# Altium footprint library UWRT_Footprint_Library_2020.PcbLib: 376 footprints (part 3 of 24)
Each footprint in its own frame and in the unit in brackets; x right, y up, seen from the top. Pads: shape width x height; smd on the part's side, far side on the other; paste and mask are expansions set on the pad; w line width, h text height; cw(c..) or ccw(c..) is an arc to the next point about the centre after c.
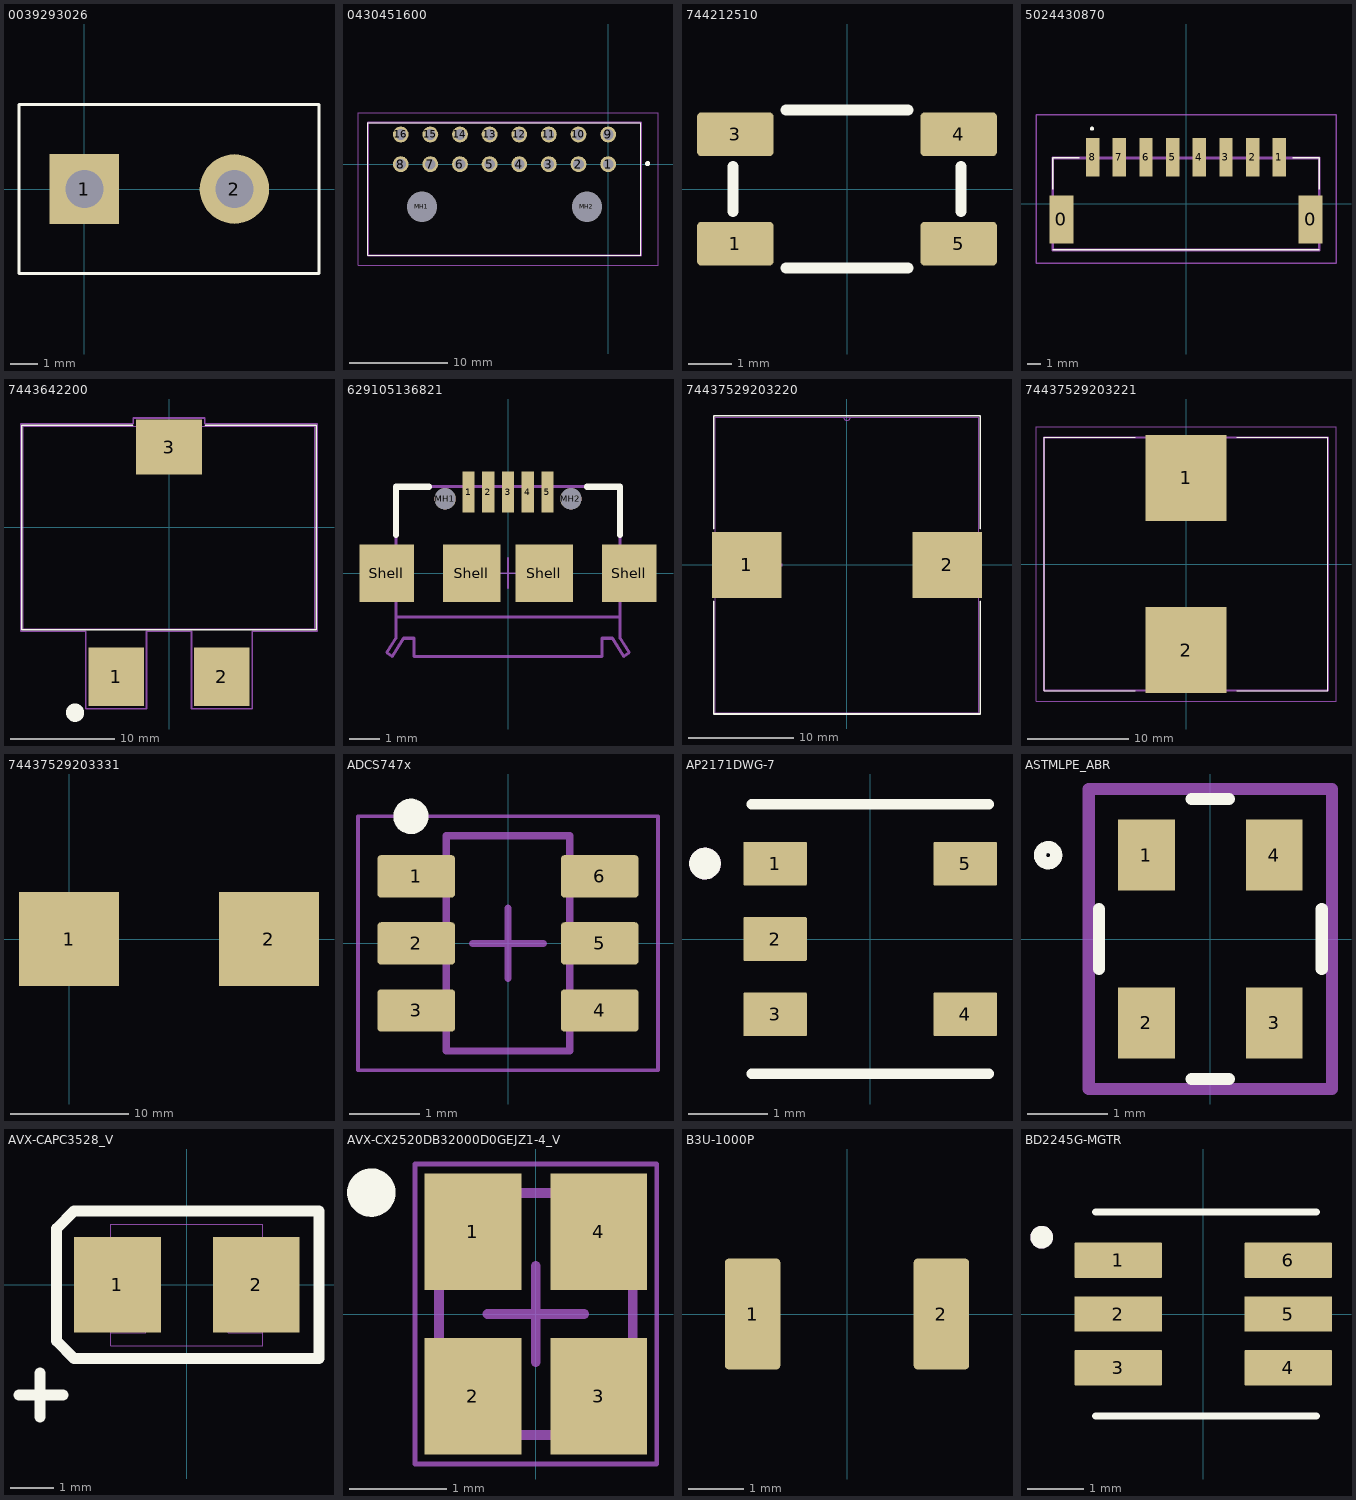
[diagram p2: the footprints below, top view; thin cyan lines are the x and y axes]

## 0039293026 [mm]
pads (2):
  rect 2.55x2.55 hole 1.4: 1(0,0)
  round 2.55 hole 1.4: 2(5.5,0)
Top Overlay:
  lines w0.12: -2.4,-3.1 8.6,-3.1 8.6,3.1 -2.4,3.1 -2.4,-3.1
3D body "039293026.stp": height 12.8, standoff -3.5, extent -2.4,-3.1 8.6,3.1

## 0430451600 [mm]
pads (18):
  round 1.605 hole 1.07: 1(0,0) 2(-3,0) 3(-6,0) 4(-9,0) 5(-12,0) 6(-15,0) 7(-18,0) 8(-21,0) 9(0,3) 10(-3,3) 11(-6,3) 12(-9,3) 13(-12,3) 14(-15,3) 15(-18,3) 16(-21,3)
  round 1.525 hole 3.05 unplated: MH1(-18.85,-4.32) MH2(-2.15,-4.32)
Top Overlay:
  lines w0.1: -24.325,-9.24 3.325,-9.24 3.325,4.2 -24.325,4.2 -24.325,-9.24
  lines w0.4: 4,0 ccw(c4,0.05) 4,0.1 ccw(c4,0.05) 4,0
Mechanical 13:
  lines w0.2: -24.325,-9.24 3.325,-9.24 3.325,4.2 -24.325,4.2 -24.325,-9.24
Mechanical 15:
  lines w0.1: -25.325,-10.24 5.05,-10.24 5.05,5.2 -25.325,5.2 -25.325,-10.24
3D body "0430451600.stp": height 8.77, standoff -3.17, extent -24.585,-8.89 3.565,3.35

## 744212510 [mm] "CMC HORIZONTAL 4 J-LEAD"
pads (4):
  rrect20% 1.75x1 smd: 1(-2.55,-1.25) 3(-2.55,1.25) 4(2.55,1.25) 5(2.55,-1.25)
Top Overlay:
  lines w0.254: -2.6,-0.508 -2.6,0.508 ; -1.397,-1.8 1.397,-1.8 ; -1.397,1.8 1.397,1.8 ; 2.6,-0.508 2.6,0.508
3D body "744212100_Download_STP_WE-SL1_rev1.stp": height 1.67, standoff 0.01, extent -2.6,-1.8 2.6,1.8

## 5024430870 [mm]
pads (10):
  rect 1.8x3.6 smd: 0(-9.35,-1.15) 0(9.35,-1.15)
  rect 1x2.9 smd: 1(7,3.5) 2(5,3.5) 3(3,3.5) 4(1,3.5) 5(-1,3.5) 6(-3,3.5) 7(-5,3.5) 8(-7,3.5)
Top Overlay:
  lines w0.1: -10,3.45 -10,1.1 -10,3.45 ; -10,3.45 -8,3.45 -10,3.45 ; 10,3.45 8,3.45 10,3.45 ; 10,3.45 10,1.1 10,3.45 ; -10,-3.45 10,-3.45 -10,-3.45
  lines w0.2: -7.1,5.65 ccw(c-7.05,5.65) -7,5.65 ; -7.1,5.65 cw(c-7.05,5.65) -7,5.65 ; -7.1,5.65 ccw(c-7.05,5.65) -7,5.65
Mechanical 13:
  lines w0.2: -10,-3.45 10,-3.45 10,3.45 -10,3.45 -10,-3.45
Mechanical 15:
  lines w0.1: -11.25,-4.45 11.25,-4.45 11.25,6.7 -11.25,6.7 -11.25,-4.45
3D body "502443-0870.stp": height 7.8, standoff 0, extent -10.07,-3.45 10.07,4.85

## 7443642200 [mm]
pads (3):
  rect 5.33x5.59 smd: 1(-5.075,-14.335) 2(5.075,-14.335)
  rect 6.35x5.28 smd: 3(0,7.72)
Top Overlay:
  circle w1.5: c-9.017,-17.78 r0.125
  lines w0.152: -3.508,9.83 -14.122,9.83 -14.122,-9.83 14.122,-9.83 14.122,9.83 3.508,9.83
Mechanical 13:
  lines w0.025: -13.995,-9.703 13.995,-9.703 13.995,9.703 -13.995,9.703 -13.995,-9.703
Mechanical 15:
  lines w0.152: -14.249,-9.957 -14.249,9.957 -3.429,9.957 -3.429,10.514 3.429,10.514 3.429,9.957 14.249,9.957 14.249,-9.957 7.994,-9.957 7.994,-17.384 2.156,-17.384 2.156,-9.957 -2.156,-9.957 -2.156,-17.384 -7.994,-17.384 -7.994,-9.957 -14.249,-9.957
3D body "7443640330_Download_STP_WE-HCF-2818_rev1 (1).stp": height 18.53, standoff 0.01, extent -14,-16.908 14,10.092

## 629105136821 [mm] "Micro USB 2.0 SMT Type B Horizontal 5 Contacts"
height 3
pads (11):
  rect 0.4x1.35 smd: 1(-1.3,2.675) 2(-0.65,2.675) 3(0,2.675) 4(0.65,2.675) 5(1.3,2.675)
  round 0.7 hole 0.7 unplated: MH1(-2.075,2.45) MH2(2.075,2.45)
  rect 1.8x1.9 smd: Shell(-4,0) Shell(4,0)
  rect 1.9x1.9 smd: Shell(-1.2,0) Shell(1.2,0)
Top Overlay:
  lines w0.2: -3.7,1.25 -3.7,2.85 -2.6,2.85 ; 2.6,2.85 3.7,2.85 3.7,1.25
Mechanical 2:
  lines w0.1: -3.7,-1.45 3.7,-1.45
  text "PCB Edge" at -1.2,-2.1 h0.41
Mechanical 13:
  lines w0.1: -1.425,2.85 -1.425,3.15 -1.175,3.15 -1.175,2.85 ; -0.775,2.85 -0.775,3.15 -0.525,3.15 -0.525,2.85 ; -0.125,2.85 -0.125,3.15 0.125,3.15 0.125,2.85 ; 0.525,2.85 0.525,3.15 0.775,3.15 0.775,2.85 ; 1.175,2.85 1.175,3.15 1.425,3.15 1.425,2.85 ; -4,-2.625 -3.7,-2.15 -3.7,2.85 3.7,2.85 3.7,-2.15 4,-2.625 3.825,-2.75 3.45,-2.15 3.1,-2.15 3.1,-2.75 -3.1,-2.75 -3.1,-2.15 -3.45,-2.15 -3.825,-2.75 -4,-2.625
Mechanical 15:
  lines w0.05: -0.5,0 0.5,0 ; 0,-0.5 0,0.5
3D body "629105136821.stp": height 2.69, standoff -0.61, extent -4,-2.73 4,3.173

## 74437529203220 [mil]
pads (2):
  rect 260x246 smd paste+0 mask+0: 1(-374,0) 2(374,0)
Top Overlay:
  lines w6: -497,-136.1 -497,-556 497,-556 497,-136.1 ; -497,136.1 -497,556 497,556 497,136.1
Mechanical 13:
  circle w0: c-244,0 r3
  lines w0: -12,551 ccw(c0,551) 12,551
  lines w1: -492,-551 492,-551 492,551 -492,551 -492,-551
3D body "IND_WE-HCF_2920_WRE.step": height 807.09, standoff 0, extent -492.01,-550.98 492.01,550.98

## 74437529203221 [mm]
pads (2):
  rect 8x8.5 smd: 1(0,8.5) 2(0,-8.5)
Top Overlay:
  lines w0.1: -5,-12.5 -14,-12.5 -14,12.5 -5,12.5 ; 5,-12.5 14,-12.5 14,12.5 5,12.5
Mechanical 13:
  lines w0.2: -14,-12.5 -14,12.5 14,12.5 14,-12.5 -14,-12.5
Mechanical 15:
  lines w0.1: -14.8,-13.55 -14.8,13.55 14.8,13.55 14.8,-13.55 -14.8,-13.55
3D body "74437529203221.stp": height 20.6, standoff 0, extent -14,-12.5 14,12.5

## 74437529203331 [mm]
pads (2):
  rect 8.5x8 smd: 1(0,0) 2(17,0)
3D body "IND_BOURNS_SRP1250.step": height 5.94, standoff 0, extent 6.853,-6.744 20.747,6.744
3D body "IND_BOURNS_SRP1250.step": height 5.94, standoff 0, extent -4.147,-6.744 9.747,6.744

## ADCS747x [mm] "sot-23-6"
pads (6):
  rrect17% 1.1x0.6 smd: 1(-1.3,0.95) 2(-1.3,0) 3(-1.3,-0.95) 4(1.3,-0.95) 5(1.3,0) 6(1.3,0.95)
Top Overlay:
  circle w0.25: c-1.375,1.8 r0.125
Mechanical 13:
  lines w0.1: -0.875,-1.525 -0.875,1.525 0.875,1.525 0.875,-1.525 -0.875,-1.525
Mechanical 15:
  lines w0.05: -2.125,-1.8 -2.125,1.8 2.125,1.8 2.125,-1.8 -2.125,-1.8
  lines w0.1: -0.5,0 0.5,0 ; 0,-0.5 0,0.5
3D body "DDC0006A.stp": height 0.9, standoff -0.02, extent -1.434,-1.485 1.434,1.485

## AP2171DWG-7 [mm]
pads (5):
  rrect5% 0.8x0.55 smd mask+0: 1(-1.2,0.95) 2(-1.2,0) 3(-1.2,-0.95) 4(1.2,-0.95) 5(1.2,0.95)
Top Overlay:
  circle w0.2: c-2.086,0.952 r0.1
  lines w0.127: -1.5,-1.7 1.5,-1.7 ; -1.5,1.7 1.5,1.7
Mechanical 13:
  circle w0.2: c-2.086,0.952 r0.1
3D body "SOT25_DIO.step": height 1.45, standoff 0, extent -1.5,-1.55 1.5,1.55

## ASTMLPE_ABR [mil]
pads (4):
  rect 28x35 smd paste+0: 1(-31.5,41.35) 2(-31.5,-41.35) 3(31.5,-41.35) 4(31.5,41.35)
Top Overlay:
  circle w6: c-80,41.35 r4
  lines w6: -55,-14.83 -55,14.83 ; -9.22,-69 9.22,-69 ; -9.22,69 9.22,69 ; 55,-14.83 55,14.83
Mechanical 15:
  lines w6: -60,-74 -60,-68.85 -60,68.85 -60,74 60,74 60,68.85 60,-68.85 60,-74 -60,-74
3D body "ASTMLPE_ABR.step": height 32.09, standoff 0, extent -45.5,-64.01 45.52,64.02
3D body: height 10, standoff 0, extent 0,0 10,10

## AVX-CAPC3528_V [mm] "SMT Capacitor, 2 Leads, Body 3.5x2.8mm"
pads (2):
  rect 2x2.2 smd: 1(-1.6,0) 2(1.6,0)
Top Overlay:
  lines w0.254: -3.87,-2.54 -2.854,-2.54 ; -3.381,-3.048 -3.381,-2.032 ; -3,-1.3 -2.6,-1.7 3.05,-1.7 3.05,1.7 -2.6,1.7 -3,1.3 -3,-1.3
Mechanical 7:
  lines w0.025: -1.748,-1.404 1.752,-1.404 1.752,1.396 -1.748,1.396 ; -1.748,-1.104 -0.948,-1.104 -0.948,1.096 -1.748,1.096 ; -1.748,-1.404 -1.748,1.396 ; 1.752,-1.104 0.952,-1.104 0.952,1.096 1.752,1.096
  text ".Designator" at -1.8,1.8 h0.5
  text ".Comment" at -1.7,-2.2 h0.5
3D body: height 0.3, standoff 0, extent -1.793,-0.665 -1.568,0.824
3D body: height 0.3, standoff 0, extent 1.578,-0.658 1.803,0.768
3D body: height 1.9, standoff 0, extent -1.704,-1.539 1.763,1.537

## AVX-CX2520DB32000D0GEJZ1-4_V [mm] "Hand Drawn, 4-Leads,Body 2.5x2mm"
height 0.55
pads (4):
  rect 1x1.2 smd: 1(-0.65,0.85) 2(-0.65,-0.85) 3(0.65,-0.85) 4(0.65,0.85)
Top Overlay:
  circle w0.25: c-1.7,1.254 r0.125
Mechanical 13:
  lines w0.1: -1,-1.25 1,-1.25 1,1.25 -1,1.25 -1,-1.25
Mechanical 15:
  lines w0.05: -1.25,-1.55 1.25,-1.55 1.25,1.55 -1.25,1.55 -1.25,-1.55
  lines w0.1: -0.5,0 0.5,0 ; 0,-0.5 0,0.5
3D body: height 0.55, standoff 0, extent -1,-1.25 1,1.25

## B3U-1000P [mm] "TACTILE SWITCH GREY"
pads (2):
  rrect15% 1x2 smd: 1(-1.7,0) 2(1.7,0)
3D body "b3u-1000p.stp": height 1.6, standoff 0, extent -2,-1.25 2,1.25

## BD2245G-MGTR [mm]
pads (6):
  rrect5% 1.55x0.62 smd mask+0: 1(-1.5,0.95) 2(-1.5,0) 3(-1.5,-0.95) 4(1.5,-0.95) 5(1.5,0) 6(1.5,0.95)
Top Overlay:
  circle w0.2: c-2.855,1.357 r0.1
  lines w0.127: -1.9,-1.8 2,-1.8 ; -1.9,1.8 2,1.8
Top Solder:
  drawing of 6 lines, arcs and shapes, not listed
Mechanical 13:
  circle w0.2: c-2.855,1.357 r0.1
3D body "SSOP6_ROM.step": height 1.25, standoff 0, extent -1.499,-1.549 1.499,1.549